# Altium footprint library standard-graphic-logo.PcbLib: 58 footprints (part 2 of 4)
Each footprint in its own frame and in the unit in brackets; x right, y up, seen from the top. Pads: shape width x height; smd on the part's side, far side on the other; paste and mask are expansions set on the pad; w line width, h text height; cw(c..) or ccw(c..) is an arc to the next point about the centre after c.
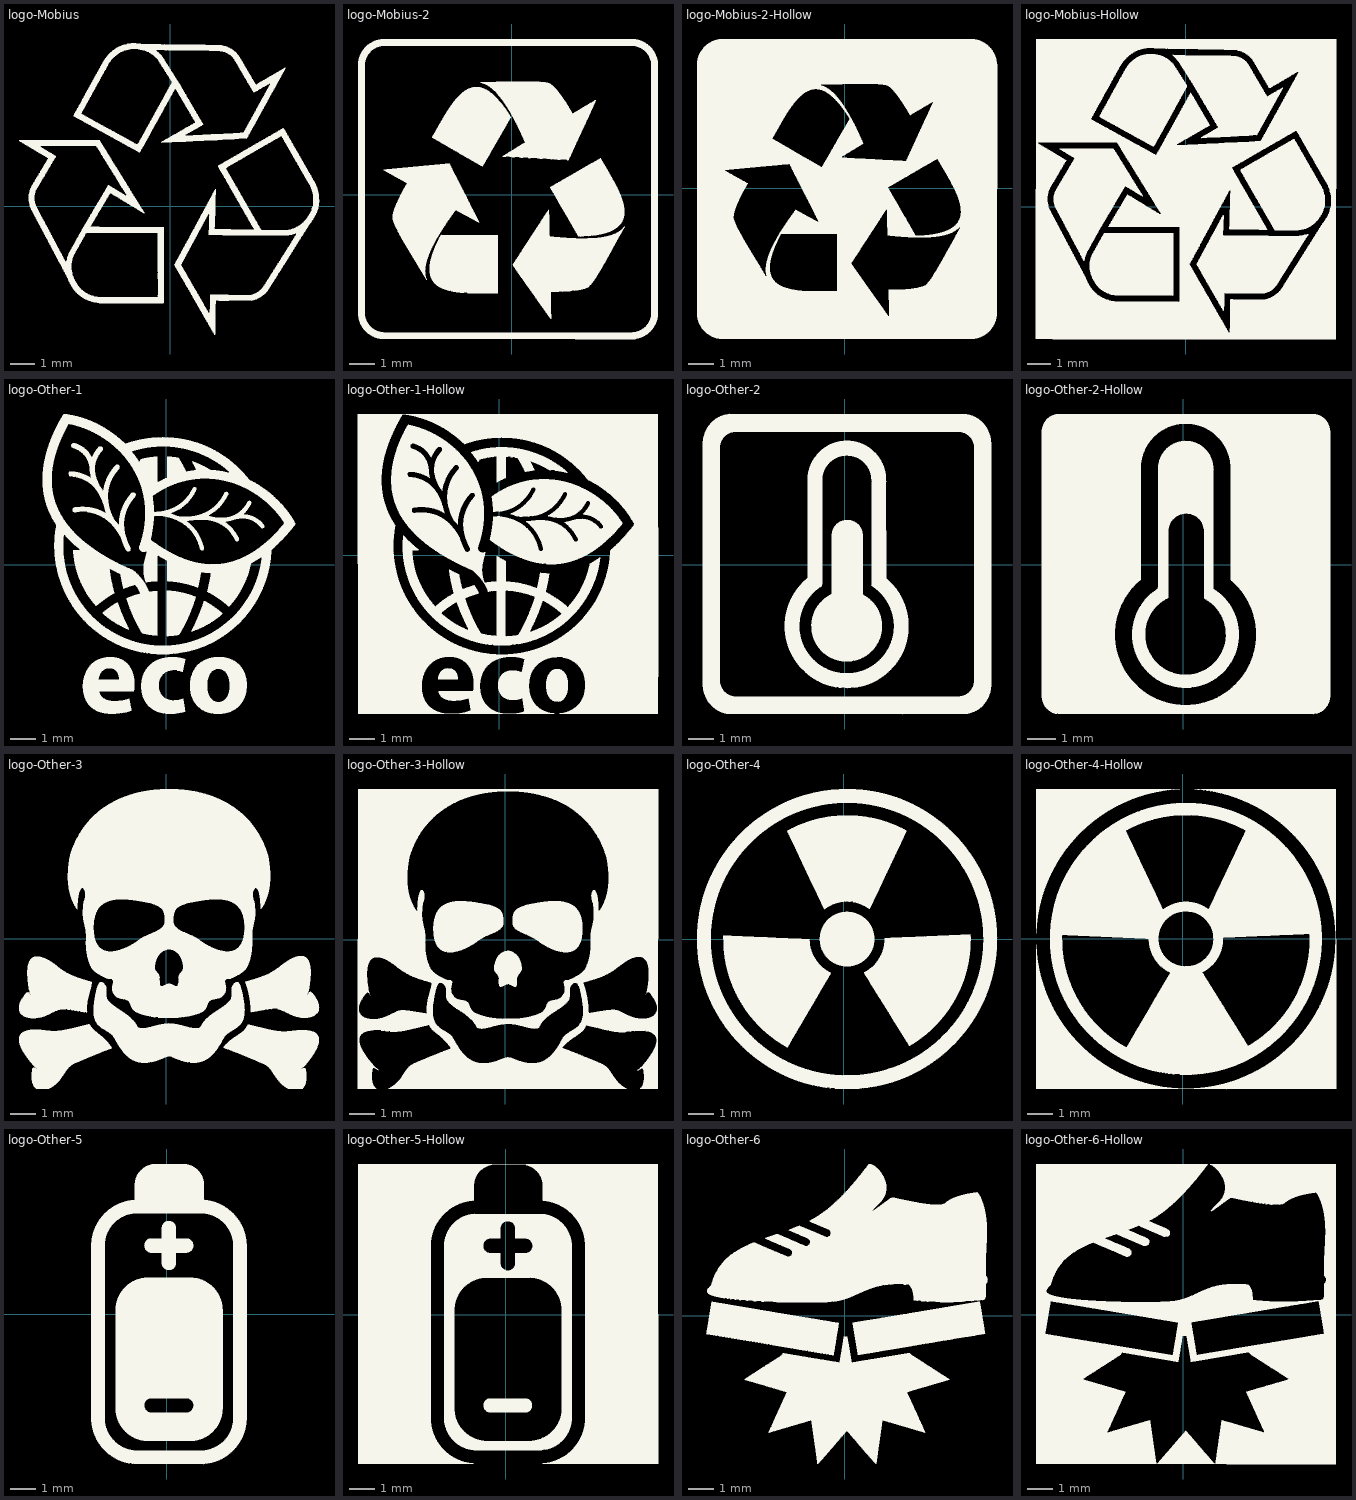
[diagram p1: the footprints below, top view; thin cyan lines are the x and y axes]

## logo-Mobius [mm]
Top Overlay:
  drawing of 3 lines, arcs and shapes, not listed

## logo-Mobius-2 [mm]
Top Overlay:
  drawing of 9 lines, arcs and shapes, not listed

## logo-Mobius-2-Hollow [mm]
Top Overlay:
  drawing of 1 lines, arcs and shapes, not listed

## logo-Mobius-Hollow [mm]
Top Overlay:
  drawing of 7 lines, arcs and shapes, not listed

## logo-Other-1 [mm]
Top Overlay:
  drawing of 8 lines, arcs and shapes, not listed
  text "TarahiBoard.com" at 1.417,-0.107 h0.1

## logo-Other-1-Hollow [mm]
Top Overlay:
  drawing of 6 lines, arcs and shapes, not listed
  text "TarahiBoard.com" at 4.084,-3.409 h0.1

## logo-Other-2 [mm]
Top Overlay:
  drawing of 3 lines, arcs and shapes, not listed
  text "TarahiBoard.com" at -0.361,-5.695 h0.1

## logo-Other-2-Hollow [mm]
Top Overlay:
  drawing of 2 lines, arcs and shapes, not listed
  text "TarahiBoard.com" at 2.687,-1.377 h0.1

## logo-Other-3 [mm]
Top Overlay:
  drawing of 6 lines, arcs and shapes, not listed
  text "TarahiBoard.com" at -0.361,3.703 h0.1

## logo-Other-3-Hollow [mm]
Top Overlay:
  drawing of 5 lines, arcs and shapes, not listed
  text "TarahiBoard.com" at 4.084,5.481 h0.1

## logo-Other-4 [mm]
Top Overlay:
  drawing of 5 lines, arcs and shapes, not listed
  text "TarahiBoard.com" at -0.615,3.576 h0.1

## logo-Other-4-Hollow [mm]
Top Overlay:
  drawing of 3 lines, arcs and shapes, not listed
  text "TarahiBoard.com" at -0.615,-4.044 h0.1

## logo-Other-5 [mm]
Top Overlay:
  drawing of 3 lines, arcs and shapes, not listed
  text "TarahiBoard.com" at -0.742,-1.885 h0.1

## logo-Other-5-Hollow [mm]
Top Overlay:
  drawing of 3 lines, arcs and shapes, not listed
  text "TarahiBoard.com" at -5.314,-0.869 h0.1

## logo-Other-6 [mm]
Top Overlay:
  drawing of 4 lines, arcs and shapes, not listed
  text "TarahiBoard.com" at 1.29,2.941 h0.1

## logo-Other-6-Hollow [mm]
Top Overlay:
  drawing of 1 lines, arcs and shapes, not listed
  text "TarahiBoard.com" at 3.449,-4.171 h0.1